# Altium schematic symbol library jlcpcb_2025_04_inductors_extended_0603.schlib: 1269 symbols (part 4 of 7) (continued)
## LQW18CNR47J00D
designator L?  Inductance: 470nH
Inductor, 470nH, ±5%, 450mΩ, 500mA, SMD 0603; Manufacturer: Murata Electronics; Manufacturer Part Number: LQW18CNR47J00D; Self-Resonant Frequency: 555MHz; Package Size: 0603; JLCPCB Basic Part: No; JLCPCB Part Number: C341701; Supplier 1: LCSC; Category: Inductors; Supplier Part Number 1: C341701; Tolerance: ±5%; Rated Current: 500mA; DC Resistance: 450mΩ; RoHS: Yes; ComponentLink1Description: Datasheet; ComponentLink1URL: https://wmsc.lcsc.com/wmsc/upload/file/pdf/v2/lcsc/2304140030_Murata-Electronics-LQW18CNR47J00D_C341701.pdf; ComponentLink2Description: JLCPCB Part URL; ComponentLink2URL: https://jlcpcb.com/partdetail/C341701; ComponentLink3Description: LCSC Part URL; ComponentLink3URL: https://lcsc.com/product-detail/Inductors-SMD_Murata-Electronics-Murata-Electronics-LQW18CNR47J00D_C341701.html
footprint IND-0603 (0603 (1608M) Inductor)
pins: 1, 2

## LQW18CNR47J0ZD
designator L?  Inductance: 470nH
Inductor, 470nH, ±5%, 450mΩ, 500mA, SMD 0603; Manufacturer: Murata Electronics; Manufacturer Part Number: LQW18CNR47J0ZD; Package Size: 0603; JLCPCB Basic Part: No; JLCPCB Part Number: C560039; Supplier 1: LCSC; Category: Inductors; Supplier Part Number 1: C560039; Tolerance: ±5%; Rated Current: 500mA; DC Resistance: 450mΩ; RoHS: Yes; ComponentLink1Description: Datasheet; ComponentLink1URL: https://wmsc.lcsc.com/wmsc/upload/file/pdf/v2/lcsc/2304140030_Murata-Electronics-LQW18CNR47J0ZD_C560039.pdf; ComponentLink2Description: JLCPCB Part URL; ComponentLink2URL: https://jlcpcb.com/partdetail/C560039; ComponentLink3Description: LCSC Part URL; ComponentLink3URL: https://lcsc.com/product-detail/Power-Inductors_Murata-Electronics-Murata-Electronics-LQW18CNR47J0ZD_C560039.html
footprint IND-0603 (0603 (1608M) Inductor)
pins: 1, 2

## LQW18CNR56J00D
designator L?  Inductance: 560nH
Inductor, 560nH, ±5%, 480mΩ, 450mA, SMD 0603; Manufacturer: Murata Electronics; Manufacturer Part Number: LQW18CNR56J00D; Self-Resonant Frequency: 10MHz; Package Size: 0603; JLCPCB Basic Part: No; JLCPCB Part Number: C91630; Supplier 1: LCSC; Category: Inductors; Supplier Part Number 1: C91630; Tolerance: ±5%; Rated Current: 450mA; DC Resistance: 480mΩ; RoHS: Yes; ComponentLink1Description: Datasheet; ComponentLink1URL: https://wmsc.lcsc.com/wmsc/upload/file/pdf/v2/lcsc/1810311111_Murata-Electronics-LQW18CNR56J00D_C91630.pdf; ComponentLink2Description: JLCPCB Part URL; ComponentLink2URL: https://jlcpcb.com/partdetail/C91630; ComponentLink3Description: LCSC Part URL; ComponentLink3URL: https://lcsc.com/product-detail/Inductors-SMD_Murata-Electronics-Murata-Electronics-LQW18CNR56J00D_C91630.html
footprint IND-0603 (0603 (1608M) Inductor)
pins: 1, 2

## LQW18CNR65J0ZD
designator L?  Inductance: 650nH
Inductor, 650nH, ±5%, 520mΩ, 430mA, SMD 0603; Manufacturer: Murata Electronics; Manufacturer Part Number: LQW18CNR65J0ZD; Self-Resonant Frequency: 510MHz; Package Size: 0603; JLCPCB Basic Part: No; JLCPCB Part Number: C1857960; Supplier 1: LCSC; Category: Inductors; Supplier Part Number 1: C1857960; Tolerance: ±5%; Rated Current: 430mA; DC Resistance: 520mΩ; RoHS: Yes; ComponentLink1Description: Datasheet; ComponentLink1URL: https://wmsc.lcsc.com/wmsc/upload/file/pdf/v2/lcsc/2304140030_Murata-Electronics-LQW18CNR65J0ZD_C1857960.pdf; ComponentLink2Description: JLCPCB Part URL; ComponentLink2URL: https://jlcpcb.com/partdetail/C1857960; ComponentLink3Description: LCSC Part URL; ComponentLink3URL: https://lcsc.com/product-detail/Inductors-SMD_Murata-Electronics-Murata-Electronics-LQW18CNR65J0ZD_C1857960.html
footprint IND-0603 (0603 (1608M) Inductor)
pins: 1, 2

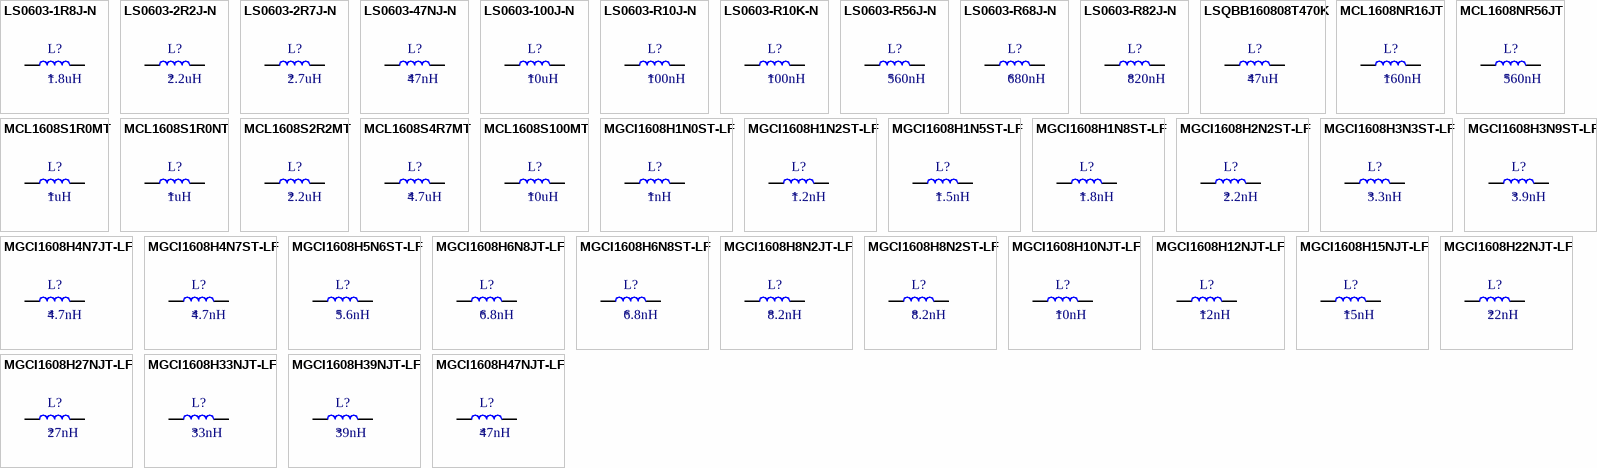
[diagram p18: symbols LS0603-1R8J-N to MGCI1608H47NJT-LF]

## LS0603-1R8J-N
designator L?  Inductance: 1.8uH
Inductor, 1.8uH, ±5%, 1.1Ω, 520mA, SMD 0603; Manufacturer: Chilisin Elec; Manufacturer Part Number: LS0603-1R8J-N; Self-Resonant Frequency: 230MHz; Q Factor: 17@7.9MHz; Package Size: 0603; JLCPCB Basic Part: No; JLCPCB Part Number: C142159; Supplier 1: LCSC; Category: Inductors; Supplier Part Number 1: C142159; Tolerance: ±5%; Rated Current: 520mA; DC Resistance: 1.1Ω; RoHS: Yes; ComponentLink1Description: Datasheet; ComponentLink1URL: https://wmsc.lcsc.com/wmsc/upload/file/pdf/v2/lcsc/2304140030_Chilisin-Elec-LS0603-1R8J-N_C142159.pdf; ComponentLink2Description: JLCPCB Part URL; ComponentLink2URL: https://jlcpcb.com/partdetail/C142159; ComponentLink3Description: LCSC Part URL; ComponentLink3URL: https://lcsc.com/product-detail/Inductors-SMD_Chilisin-Elec-Chilisin-Elec-LS0603-1R8J-N_C142159.html
footprint IND-0603 (0603 (1608M) Inductor)
pins: 1, 2

## LS0603-2R2J-N
designator L?  Inductance: 2.2uH
Inductor, 2.2uH, ±5%, 1200mΩ, 500mA, SMD 0603; Manufacturer: Chilisin Elec; Manufacturer Part Number: LS0603-2R2J-N; Self-Resonant Frequency: 140MHz; Q Factor: 17@7.9MHz; Package Size: 0603; JLCPCB Basic Part: No; JLCPCB Part Number: C2935084; Supplier 1: LCSC; Category: Inductors; Supplier Part Number 1: C2935084; Tolerance: ±5%; Rated Current: 500mA; DC Resistance: 1200mΩ; RoHS: Yes; ComponentLink1Description: Datasheet; ComponentLink1URL: https://wmsc.lcsc.com/wmsc/upload/file/pdf/v2/lcsc/2403291731_Chilisin-Elec-LS0603-2R2J-N_C2935084.pdf; ComponentLink2Description: JLCPCB Part URL; ComponentLink2URL: https://jlcpcb.com/partdetail/C2935084; ComponentLink3Description: LCSC Part URL; ComponentLink3URL: https://lcsc.com/product-detail/Inductors-SMD_Chilisin-Elec-Chilisin-Elec-LS0603-2R2J-N_C2935084.html
footprint IND-0603 (0603 (1608M) Inductor)
pins: 1, 2

## LS0603-2R7J-N
designator L?  Inductance: 2.7uH
Inductor, 2.7uH, ±5%, 1.5Ω, 480mA, SMD 0603; Manufacturer: Chilisin Elec; Manufacturer Part Number: LS0603-2R7J-N; Self-Resonant Frequency: 105MHz; Q Factor: 17@7.9MHz; Package Size: 0603; JLCPCB Basic Part: No; JLCPCB Part Number: C280485; Supplier 1: LCSC; Category: Inductors; Supplier Part Number 1: C280485; Tolerance: ±5%; Rated Current: 480mA; DC Resistance: 1.5Ω; RoHS: Yes; ComponentLink1Description: Datasheet; ComponentLink1URL: https://wmsc.lcsc.com/wmsc/upload/file/pdf/v2/lcsc/2304140030_Chilisin-Elec-LS0603-2R7J-N_C280485.pdf; ComponentLink2Description: JLCPCB Part URL; ComponentLink2URL: https://jlcpcb.com/partdetail/C280485; ComponentLink3Description: LCSC Part URL; ComponentLink3URL: https://lcsc.com/product-detail/Inductors-SMD_Chilisin-Elec-Chilisin-Elec-LS0603-2R7J-N_C280485.html
footprint IND-0603 (0603 (1608M) Inductor)
pins: 1, 2

## LS0603-47NJ-N
designator L?  Inductance: 47nH
Inductor, 47nH, ±5%, 75mΩ, 1.5A, SMD 0603; Manufacturer: Chilisin Elec; Manufacturer Part Number: LS0603-47NJ-N; Self-Resonant Frequency: 1.7GHz; Q Factor: 17@7.9MHz; Package Size: 0603; JLCPCB Basic Part: No; JLCPCB Part Number: C285885; Supplier 1: LCSC; Category: Inductors; Supplier Part Number 1: C285885; Tolerance: ±5%; Rated Current: 1.5A; DC Resistance: 75mΩ; RoHS: Yes; ComponentLink1Description: Datasheet; ComponentLink1URL: https://wmsc.lcsc.com/wmsc/upload/file/pdf/v2/lcsc/2304140030_Chilisin-Elec-LS0603-47NJ-N_C285885.pdf; ComponentLink2Description: JLCPCB Part URL; ComponentLink2URL: https://jlcpcb.com/partdetail/C285885; ComponentLink3Description: LCSC Part URL; ComponentLink3URL: https://lcsc.com/product-detail/Inductors-SMD_Chilisin-Elec-Chilisin-Elec-LS0603-47NJ-N_C285885.html
footprint IND-0603 (0603 (1608M) Inductor)
pins: 1, 2

## LS0603-100J-N
designator L?  Inductance: 10uH
Inductor, 10uH, ±5%, 4.8Ω, 300mA, SMD 0603; Manufacturer: Chilisin Elec; Manufacturer Part Number: LS0603-100J-N; Self-Resonant Frequency: 40MHz; Q Factor: 19@7.9MHz; Package Size: 0603; JLCPCB Basic Part: No; JLCPCB Part Number: C373750; Supplier 1: LCSC; Category: Inductors; Supplier Part Number 1: C373750; Tolerance: ±5%; Rated Current: 300mA; DC Resistance: 4.8Ω; RoHS: Yes; ComponentLink1Description: Datasheet; ComponentLink1URL: https://wmsc.lcsc.com/wmsc/upload/file/pdf/v2/lcsc/2304140030_Chilisin-Elec-LS0603-100J-N_C373750.pdf; ComponentLink2Description: JLCPCB Part URL; ComponentLink2URL: https://jlcpcb.com/partdetail/C373750; ComponentLink3Description: LCSC Part URL; ComponentLink3URL: https://lcsc.com/product-detail/Inductors-SMD_Chilisin-Elec-Chilisin-Elec-LS0603-100J-N_C373750.html
footprint IND-0603 (0603 (1608M) Inductor)
pins: 1, 2

## LS0603-R10J-N
designator L?  Inductance: 100nH
Inductor, 100nH, ±5%, 130mΩ, 1.5A, SMD 0603; Manufacturer: Chilisin Elec; Manufacturer Part Number: LS0603-R10J-N; Self-Resonant Frequency: 1.65GHz; Q Factor: 17@7.9MHz; Package Size: 0603; JLCPCB Basic Part: No; JLCPCB Part Number: C285884; Supplier 1: LCSC; Category: Inductors; Supplier Part Number 1: C285884; Tolerance: ±5%; Rated Current: 1.5A; DC Resistance: 130mΩ; RoHS: Yes; ComponentLink1Description: Datasheet; ComponentLink1URL: https://wmsc.lcsc.com/wmsc/upload/file/pdf/v2/lcsc/2304140030_Chilisin-Elec-LS0603-R10J-N_C285884.pdf; ComponentLink2Description: JLCPCB Part URL; ComponentLink2URL: https://jlcpcb.com/partdetail/C285884; ComponentLink3Description: LCSC Part URL; ComponentLink3URL: https://lcsc.com/product-detail/Inductors-SMD_Chilisin-Elec-Chilisin-Elec-LS0603-R10J-N_C285884.html
footprint IND-0603 (0603 (1608M) Inductor)
pins: 1, 2

## LS0603-R10K-N
designator L?  Inductance: 100nH
Inductor, 100nH, ±10%, 130mΩ, 1.5A, SMD 0603; Manufacturer: Chilisin Elec; Manufacturer Part Number: LS0603-R10K-N; Self-Resonant Frequency: 1.65GHz; Q Factor: 17@7.9MHz; Package Size: 0603; JLCPCB Basic Part: No; JLCPCB Part Number: C285883; Supplier 1: LCSC; Category: Inductors; Supplier Part Number 1: C285883; Tolerance: ±10%; Rated Current: 1.5A; DC Resistance: 130mΩ; RoHS: Yes; ComponentLink1Description: Datasheet; ComponentLink1URL: https://wmsc.lcsc.com/wmsc/upload/file/pdf/v2/lcsc/2304140030_Chilisin-Elec-LS0603-R10K-N_C285883.pdf; ComponentLink2Description: JLCPCB Part URL; ComponentLink2URL: https://jlcpcb.com/partdetail/C285883; ComponentLink3Description: LCSC Part URL; ComponentLink3URL: https://lcsc.com/product-detail/Inductors-SMD_Chilisin-Elec-Chilisin-Elec-LS0603-R10K-N_C285883.html
footprint IND-0603 (0603 (1608M) Inductor)
pins: 1, 2

## LS0603-R56J-N
designator L?  Inductance: 560nH
Inductor, 560nH, ±5%, 440mΩ, 850mA, SMD 0603; Manufacturer: Chilisin Elec; Manufacturer Part Number: LS0603-R56J-N; Self-Resonant Frequency: 600MHz; Q Factor: 17@7.9MHz; Package Size: 0603; JLCPCB Basic Part: No; JLCPCB Part Number: C472422; Supplier 1: LCSC; Category: Inductors; Supplier Part Number 1: C472422; Tolerance: ±5%; Rated Current: 850mA; DC Resistance: 440mΩ; RoHS: Yes; ComponentLink1Description: Datasheet; ComponentLink1URL: https://wmsc.lcsc.com/wmsc/upload/file/pdf/v2/lcsc/2304140030_Chilisin-Elec-LS0603-R56J-N_C472422.pdf; ComponentLink2Description: JLCPCB Part URL; ComponentLink2URL: https://jlcpcb.com/partdetail/C472422; ComponentLink3Description: LCSC Part URL; ComponentLink3URL: https://lcsc.com/product-detail/Inductors-SMD_Chilisin-Elec-Chilisin-Elec-LS0603-R56J-N_C472422.html
footprint IND-0603 (0603 (1608M) Inductor)
pins: 1, 2

## LS0603-R68J-N
designator L?  Inductance: 680nH
Inductor, 680nH, ±5%, 520mΩ, 850mA, SMD 0603; Manufacturer: Chilisin Elec; Manufacturer Part Number: LS0603-R68J-N; Self-Resonant Frequency: 600MHz; Q Factor: 17@7.9MHz; Package Size: 0603; JLCPCB Basic Part: No; JLCPCB Part Number: C280487; Supplier 1: LCSC; Category: Inductors; Supplier Part Number 1: C280487; Tolerance: ±5%; Rated Current: 850mA; DC Resistance: 520mΩ; RoHS: Yes; ComponentLink1Description: Datasheet; ComponentLink1URL: https://wmsc.lcsc.com/wmsc/upload/file/pdf/v2/lcsc/2304140030_Chilisin-Elec-LS0603-R68J-N_C280487.pdf; ComponentLink2Description: JLCPCB Part URL; ComponentLink2URL: https://jlcpcb.com/partdetail/C280487; ComponentLink3Description: LCSC Part URL; ComponentLink3URL: https://lcsc.com/product-detail/Inductors-SMD_Chilisin-Elec-Chilisin-Elec-LS0603-R68J-N_C280487.html
footprint IND-0603 (0603 (1608M) Inductor)
pins: 1, 2

## LS0603-R82J-N
designator L?  Inductance: 820nH
Inductor, 820nH, ±5%, 690mΩ, 750mA, SMD 0603; Manufacturer: Chilisin Elec; Manufacturer Part Number: LS0603-R82J-N; Self-Resonant Frequency: 480MHz; Q Factor: 17@7.9MHz; Package Size: 0603; JLCPCB Basic Part: No; JLCPCB Part Number: C280488; Supplier 1: LCSC; Category: Inductors; Supplier Part Number 1: C280488; Tolerance: ±5%; Rated Current: 750mA; DC Resistance: 690mΩ; RoHS: Yes; ComponentLink1Description: Datasheet; ComponentLink1URL: https://wmsc.lcsc.com/wmsc/upload/file/pdf/v2/lcsc/2304140030_Chilisin-Elec-LS0603-R82J-N_C280488.pdf; ComponentLink2Description: JLCPCB Part URL; ComponentLink2URL: https://jlcpcb.com/partdetail/C280488; ComponentLink3Description: LCSC Part URL; ComponentLink3URL: https://lcsc.com/product-detail/Inductors-SMD_Chilisin-Elec-Chilisin-Elec-LS0603-R82J-N_C280488.html
footprint IND-0603 (0603 (1608M) Inductor)
pins: 1, 2

## LSQBB160808T470K
designator L?  Inductance: 47uH
Inductor, 47uH, ±10%, 2.5Ω, 35mA, SMD 0603; Manufacturer: Taiyo Yuden; Manufacturer Part Number: LSQBB160808T470K; Package Size: 0603; JLCPCB Basic Part: No; JLCPCB Part Number: C223245; Supplier 1: LCSC; Category: Inductors; Supplier Part Number 1: C223245; Tolerance: ±10%; Rated Current: 35mA; DC Resistance: 2.5Ω; RoHS: Yes; ComponentLink1Description: Datasheet; ComponentLink2Description: JLCPCB Part URL; ComponentLink2URL: https://jlcpcb.com/partdetail/C223245; ComponentLink3Description: LCSC Part URL; ComponentLink3URL: https://lcsc.com/product-detail/Inductors-SMD_Taiyo-Yuden-Taiyo-Yuden-LBMF1608T470K_C223245.html
footprint IND-0603 (0603 (1608M) Inductor)
pins: 1, 2

## MCL1608NR16JT
designator L?  Inductance: 160nH
Inductor, 160nH, ±5%, 156mΩ, 700mA, SMD 0603; Manufacturer: Sunlord; Manufacturer Part Number: MCL1608NR16JT; Saturation Current: 1.1A; Package Size: 0603; JLCPCB Basic Part: No; JLCPCB Part Number: C370008; Supplier 1: LCSC; Category: Inductors; Supplier Part Number 1: C370008; Tolerance: ±5%; Rated Current: 700mA; DC Resistance: 156mΩ; RoHS: Yes; ComponentLink1Description: Datasheet; ComponentLink1URL: https://wmsc.lcsc.com/wmsc/upload/file/pdf/v2/lcsc/2310271619_Sunlord-MCL1608NR16JT_C370008.pdf; ComponentLink2Description: JLCPCB Part URL; ComponentLink2URL: https://jlcpcb.com/partdetail/C370008; ComponentLink3Description: LCSC Part URL; ComponentLink3URL: https://lcsc.com/product-detail/Inductors-SMD_Sunlord-Sunlord-MCL1608NR16JT_C370008.html
footprint IND-0603 (0603 (1608M) Inductor)
pins: 1, 2

## MCL1608NR56JT
designator L?  Inductance: 560nH
Inductor, 560nH, ±5%, 520mΩ, 400mA, SMD 0603; Manufacturer: Sunlord; Manufacturer Part Number: MCL1608NR56JT; Saturation Current: 550mA; Self-Resonant Frequency: 25MHz; Package Size: 0603; JLCPCB Basic Part: No; JLCPCB Part Number: C370009; Supplier 1: LCSC; Category: Inductors; Supplier Part Number 1: C370009; Tolerance: ±5%; Rated Current: 400mA; DC Resistance: 520mΩ; RoHS: Yes; ComponentLink1Description: Datasheet; ComponentLink1URL: https://wmsc.lcsc.com/wmsc/upload/file/pdf/v2/lcsc/2310271619_Sunlord-MCL1608NR56JT_C370009.pdf; ComponentLink2Description: JLCPCB Part URL; ComponentLink2URL: https://jlcpcb.com/partdetail/C370009; ComponentLink3Description: LCSC Part URL; ComponentLink3URL: https://lcsc.com/product-detail/Inductors-SMD_Sunlord-Sunlord-MCL1608NR56JT_C370009.html
footprint IND-0603 (0603 (1608M) Inductor)
pins: 1, 2

## MCL1608S1R0MT
designator L?  Inductance: 1uH
Inductor, 1uH, ±20%, 260mΩ, 190mA, SMD 0603; Manufacturer: Sunlord; Manufacturer Part Number: MCL1608S1R0MT; Self-Resonant Frequency: 75MHz; Package Size: 0603; JLCPCB Basic Part: No; JLCPCB Part Number: C98324; Supplier 1: LCSC; Category: Inductors; Supplier Part Number 1: C98324; Tolerance: ±20%; Rated Current: 190mA; DC Resistance: 260mΩ; RoHS: Yes; ComponentLink1Description: Datasheet; ComponentLink1URL: https://wmsc.lcsc.com/wmsc/upload/file/pdf/v2/lcsc/2310301640_Sunlord-MCL1608S1R0MT_C98324.pdf; ComponentLink2Description: JLCPCB Part URL; ComponentLink2URL: https://jlcpcb.com/partdetail/C98324; ComponentLink3Description: LCSC Part URL; ComponentLink3URL: https://lcsc.com/product-detail/Inductors-SMD_Sunlord-Sunlord-MCL1608S1R0MT_C98324.html
footprint IND-0603 (0603 (1608M) Inductor)
pins: 1, 2

## MCL1608S1R0NT
designator L?  Inductance: 1uH
Inductor, 1uH, SMD 0603; Manufacturer: Sunlord; Manufacturer Part Number: MCL1608S1R0NT; Package Size: 0603; JLCPCB Basic Part: No; JLCPCB Part Number: C2991761; Supplier 1: LCSC; Category: Inductors; Supplier Part Number 1: C2991761; RoHS: Yes; ComponentLink1Description: Datasheet; ComponentLink1URL: https://wmsc.lcsc.com/wmsc/upload/file/pdf/v2/lcsc/2310301640_Sunlord-MCL1608S1R0NT_C2991761.pdf; ComponentLink2Description: JLCPCB Part URL; ComponentLink2URL: https://jlcpcb.com/partdetail/C2991761; ComponentLink3Description: LCSC Part URL; ComponentLink3URL: https://lcsc.com/product-detail/Inductors-SMD_Sunlord-Sunlord-MCL1608S1R0NT_C2991761.html
footprint IND-0603 (0603 (1608M) Inductor)
pins: 1, 2

## MCL1608S2R2MT
designator L?  Inductance: 2.2uH
Inductor, 2.2uH, ±20%, 520mΩ, 140mA, SMD 0603; Manufacturer: Sunlord; Manufacturer Part Number: MCL1608S2R2MT; Package Size: 0603; JLCPCB Basic Part: No; JLCPCB Part Number: C95966; Supplier 1: LCSC; Category: Inductors; Supplier Part Number 1: C95966; Tolerance: ±20%; Rated Current: 140mA; DC Resistance: 520mΩ; RoHS: Yes; ComponentLink1Description: Datasheet; ComponentLink1URL: https://wmsc.lcsc.com/wmsc/upload/file/pdf/v2/lcsc/2310301640_Sunlord-MCL1608S2R2MT_C95966.pdf; ComponentLink2Description: JLCPCB Part URL; ComponentLink2URL: https://jlcpcb.com/partdetail/C95966; ComponentLink3Description: LCSC Part URL; ComponentLink3URL: https://lcsc.com/product-detail/Inductors-SMD_Sunlord-Sunlord-MCL1608S2R2MT_C95966.html
footprint IND-0603 (0603 (1608M) Inductor)
pins: 1, 2

## MCL1608S4R7MT
designator L?  Inductance: 4.7uH
Inductor, 4.7uH, ±20%, 780mΩ, 100mA, SMD 0603; Manufacturer: Sunlord; Manufacturer Part Number: MCL1608S4R7MT; Self-Resonant Frequency: 35MHz; Package Size: 0603; JLCPCB Basic Part: No; JLCPCB Part Number: C43722; Supplier 1: LCSC; Category: Inductors; Supplier Part Number 1: C43722; Tolerance: ±20%; Rated Current: 100mA; DC Resistance: 780mΩ; RoHS: Yes; ComponentLink1Description: Datasheet; ComponentLink1URL: https://wmsc.lcsc.com/wmsc/upload/file/pdf/v2/lcsc/2310301640_Sunlord-MCL1608S4R7MT_C43722.pdf; ComponentLink2Description: JLCPCB Part URL; ComponentLink2URL: https://jlcpcb.com/partdetail/C43722; ComponentLink3Description: LCSC Part URL; ComponentLink3URL: https://lcsc.com/product-detail/Inductors-SMD_Sunlord-Sunlord-MCL1608S4R7MT_C43722.html
footprint IND-0603 (0603 (1608M) Inductor)
pins: 1, 2

## MCL1608S100MT
designator L?  Inductance: 10uH
Inductor, 10uH, ±20%, 1.17Ω, 50mA, SMD 0603; Manufacturer: Sunlord; Manufacturer Part Number: MCL1608S100MT; Self-Resonant Frequency: 20MHz; Package Size: 0603; JLCPCB Basic Part: No; JLCPCB Part Number: C51942; Supplier 1: LCSC; Category: Inductors; Supplier Part Number 1: C51942; Tolerance: ±20%; Rated Current: 50mA; DC Resistance: 1.17Ω; RoHS: Yes; ComponentLink1Description: Datasheet; ComponentLink1URL: https://wmsc.lcsc.com/wmsc/upload/file/pdf/v2/lcsc/2310271620_Sunlord-MCL1608S100MT_C51942.pdf; ComponentLink2Description: JLCPCB Part URL; ComponentLink2URL: https://jlcpcb.com/partdetail/C51942; ComponentLink3Description: LCSC Part URL; ComponentLink3URL: https://lcsc.com/product-detail/Inductors-SMD_Sunlord-Sunlord-MCL1608S100MT_C51942.html
footprint IND-0603 (0603 (1608M) Inductor)
pins: 1, 2

## MGCI1608H1N0ST-LF
designator L?  Inductance: 1nH
Inductor, 1nH, 50mΩ, 500mA, SMD 0603; Manufacturer: microgate; Manufacturer Part Number: MGCI1608H1N0ST-LF; Package Size: 0603; JLCPCB Basic Part: No; JLCPCB Part Number: C281020; Supplier 1: LCSC; Category: Inductors; Supplier Part Number 1: C281020; Rated Current: 500mA; DC Resistance: 50mΩ; RoHS: Yes; ComponentLink1Description: Datasheet; ComponentLink1URL: https://wmsc.lcsc.com/wmsc/upload/file/pdf/v2/lcsc/2304140030_microgate-MGCI1608H1N0ST-LF_C281020.pdf; ComponentLink2Description: JLCPCB Part URL; ComponentLink2URL: https://jlcpcb.com/partdetail/C281020; ComponentLink3Description: LCSC Part URL; ComponentLink3URL: https://lcsc.com/product-detail/Inductors-SMD_microgate-microgate-MGCI1608H1N0ST-LF_C281020.html
footprint IND-0603 (0603 (1608M) Inductor)
pins: 1, 2

## MGCI1608H1N2ST-LF
designator L?  Inductance: 1.2nH
Inductor, 1.2nH, 50mΩ, 500mA, SMD 0603; Manufacturer: microgate; Manufacturer Part Number: MGCI1608H1N2ST-LF; Package Size: 0603; JLCPCB Basic Part: No; JLCPCB Part Number: C281021; Supplier 1: LCSC; Category: Inductors; Supplier Part Number 1: C281021; Rated Current: 500mA; DC Resistance: 50mΩ; RoHS: Yes; ComponentLink1Description: Datasheet; ComponentLink1URL: https://wmsc.lcsc.com/wmsc/upload/file/pdf/v2/lcsc/2304140030_microgate-MGCI1608H1N2ST-LF_C281021.pdf; ComponentLink2Description: JLCPCB Part URL; ComponentLink2URL: https://jlcpcb.com/partdetail/C281021; ComponentLink3Description: LCSC Part URL; ComponentLink3URL: https://lcsc.com/product-detail/Inductors-SMD_microgate-microgate-MGCI1608H1N2ST-LF_C281021.html
footprint IND-0603 (0603 (1608M) Inductor)
pins: 1, 2

## MGCI1608H1N5ST-LF
designator L?  Inductance: 1.5nH
Inductor, 1.5nH, 100mΩ, 500mA, SMD 0603; Manufacturer: microgate; Manufacturer Part Number: MGCI1608H1N5ST-LF; Package Size: 0603; JLCPCB Basic Part: No; JLCPCB Part Number: C281022; Supplier 1: LCSC; Category: Inductors; Supplier Part Number 1: C281022; Rated Current: 500mA; DC Resistance: 100mΩ; RoHS: Yes; ComponentLink1Description: Datasheet; ComponentLink1URL: https://wmsc.lcsc.com/wmsc/upload/file/pdf/v2/lcsc/2304140030_microgate-MGCI1608H1N5ST-LF_C281022.pdf; ComponentLink2Description: JLCPCB Part URL; ComponentLink2URL: https://jlcpcb.com/partdetail/C281022; ComponentLink3Description: LCSC Part URL; ComponentLink3URL: https://lcsc.com/product-detail/Inductors-SMD_microgate-microgate-MGCI1608H1N5ST-LF_C281022.html
footprint IND-0603 (0603 (1608M) Inductor)
pins: 1, 2

## MGCI1608H1N8ST-LF
designator L?  Inductance: 1.8nH
Inductor, 1.8nH, 100mΩ, 500mA, SMD 0603; Manufacturer: microgate; Manufacturer Part Number: MGCI1608H1N8ST-LF; Package Size: 0603; JLCPCB Basic Part: No; JLCPCB Part Number: C281023; Supplier 1: LCSC; Category: Inductors; Supplier Part Number 1: C281023; Rated Current: 500mA; DC Resistance: 100mΩ; RoHS: Yes; ComponentLink1Description: Datasheet; ComponentLink1URL: https://wmsc.lcsc.com/wmsc/upload/file/pdf/v2/lcsc/2304140030_microgate-MGCI1608H1N8ST-LF_C281023.pdf; ComponentLink2Description: JLCPCB Part URL; ComponentLink2URL: https://jlcpcb.com/partdetail/C281023; ComponentLink3Description: LCSC Part URL; ComponentLink3URL: https://lcsc.com/product-detail/Inductors-SMD_microgate-microgate-MGCI1608H1N8ST-LF_C281023.html
footprint IND-0603 (0603 (1608M) Inductor)
pins: 1, 2

## MGCI1608H2N2ST-LF
designator L?  Inductance: 2.2nH
Inductor, 2.2nH, 100mΩ, 500mA, SMD 0603; Manufacturer: microgate; Manufacturer Part Number: MGCI1608H2N2ST-LF; Package Size: 0603; JLCPCB Basic Part: No; JLCPCB Part Number: C281024; Supplier 1: LCSC; Category: Inductors; Supplier Part Number 1: C281024; Rated Current: 500mA; DC Resistance: 100mΩ; RoHS: Yes; ComponentLink1Description: Datasheet; ComponentLink1URL: https://wmsc.lcsc.com/wmsc/upload/file/pdf/v2/lcsc/2304140030_microgate-MGCI1608H2N2ST-LF_C281024.pdf; ComponentLink2Description: JLCPCB Part URL; ComponentLink2URL: https://jlcpcb.com/partdetail/C281024; ComponentLink3Description: LCSC Part URL; ComponentLink3URL: https://lcsc.com/product-detail/Inductors-SMD_microgate-microgate-MGCI1608H2N2ST-LF_C281024.html
footprint IND-0603 (0603 (1608M) Inductor)
pins: 1, 2

## MGCI1608H3N3ST-LF
designator L?  Inductance: 3.3nH
Inductor, 3.3nH, 120mΩ, 500mA, SMD 0603; Manufacturer: microgate; Manufacturer Part Number: MGCI1608H3N3ST-LF; Package Size: 0603; JLCPCB Basic Part: No; JLCPCB Part Number: C281026; Supplier 1: LCSC; Category: Inductors; Supplier Part Number 1: C281026; Rated Current: 500mA; DC Resistance: 120mΩ; RoHS: Yes; ComponentLink1Description: Datasheet; ComponentLink1URL: https://wmsc.lcsc.com/wmsc/upload/file/pdf/v2/lcsc/2304140030_microgate-MGCI1608H3N3ST-LF_C281026.pdf; ComponentLink2Description: JLCPCB Part URL; ComponentLink2URL: https://jlcpcb.com/partdetail/C281026; ComponentLink3Description: LCSC Part URL; ComponentLink3URL: https://lcsc.com/product-detail/Inductors-SMD_microgate-microgate-MGCI1608H3N3ST-LF_C281026.html
footprint IND-0603 (0603 (1608M) Inductor)
pins: 1, 2

## MGCI1608H3N9ST-LF
designator L?  Inductance: 3.9nH
Inductor, 3.9nH, 140mΩ, 500mA, SMD 0603; Manufacturer: microgate; Manufacturer Part Number: MGCI1608H3N9ST-LF; Package Size: 0603; JLCPCB Basic Part: No; JLCPCB Part Number: C281027; Supplier 1: LCSC; Category: Inductors; Supplier Part Number 1: C281027; Rated Current: 500mA; DC Resistance: 140mΩ; RoHS: Yes; ComponentLink1Description: Datasheet; ComponentLink1URL: https://wmsc.lcsc.com/wmsc/upload/file/pdf/v2/lcsc/2304140030_microgate-MGCI1608H3N9ST-LF_C281027.pdf; ComponentLink2Description: JLCPCB Part URL; ComponentLink2URL: https://jlcpcb.com/partdetail/C281027; ComponentLink3Description: LCSC Part URL; ComponentLink3URL: https://lcsc.com/product-detail/Inductors-SMD_microgate-microgate-MGCI1608H3N9ST-LF_C281027.html
footprint IND-0603 (0603 (1608M) Inductor)
pins: 1, 2

## MGCI1608H4N7JT-LF
designator L?  Inductance: 4.7nH
Inductor, 4.7nH, ±5%, 160mΩ, 500mA, SMD 0603; Manufacturer: microgate; Manufacturer Part Number: MGCI1608H4N7JT-LF; Package Size: 0603; JLCPCB Basic Part: No; JLCPCB Part Number: C281028; Supplier 1: LCSC; Category: Inductors; Supplier Part Number 1: C281028; Tolerance: ±5%; Rated Current: 500mA; DC Resistance: 160mΩ; RoHS: Yes; ComponentLink1Description: Datasheet; ComponentLink1URL: https://wmsc.lcsc.com/wmsc/upload/file/pdf/v2/lcsc/2304140030_microgate-MGCI1608H4N7JT-LF_C281028.pdf; ComponentLink2Description: JLCPCB Part URL; ComponentLink2URL: https://jlcpcb.com/partdetail/C281028; ComponentLink3Description: LCSC Part URL; ComponentLink3URL: https://lcsc.com/product-detail/Inductors-SMD_microgate-microgate-MGCI1608H4N7JT-LF_C281028.html
footprint IND-0603 (0603 (1608M) Inductor)
pins: 1, 2

## MGCI1608H4N7ST-LF
designator L?  Inductance: 4.7nH
Inductor, 4.7nH, 160mΩ, 500mA, SMD 0603; Manufacturer: microgate; Manufacturer Part Number: MGCI1608H4N7ST-LF; Package Size: 0603; JLCPCB Basic Part: No; JLCPCB Part Number: C281029; Supplier 1: LCSC; Category: Inductors; Supplier Part Number 1: C281029; Rated Current: 500mA; DC Resistance: 160mΩ; RoHS: Yes; ComponentLink1Description: Datasheet; ComponentLink1URL: https://wmsc.lcsc.com/wmsc/upload/file/pdf/v2/lcsc/2304140030_microgate-MGCI1608H4N7ST-LF_C281029.pdf; ComponentLink2Description: JLCPCB Part URL; ComponentLink2URL: https://jlcpcb.com/partdetail/C281029; ComponentLink3Description: LCSC Part URL; ComponentLink3URL: https://lcsc.com/product-detail/Inductors-SMD_microgate-microgate-MGCI1608H4N7ST-LF_C281029.html
footprint IND-0603 (0603 (1608M) Inductor)
pins: 1, 2

## MGCI1608H5N6ST-LF
designator L?  Inductance: 5.6nH
Inductor, 5.6nH, 180mΩ, 500mA, SMD 0603; Manufacturer: microgate; Manufacturer Part Number: MGCI1608H5N6ST-LF; Package Size: 0603; JLCPCB Basic Part: No; JLCPCB Part Number: C281030; Supplier 1: LCSC; Category: Inductors; Supplier Part Number 1: C281030; Rated Current: 500mA; DC Resistance: 180mΩ; RoHS: Yes; ComponentLink1Description: Datasheet; ComponentLink1URL: https://wmsc.lcsc.com/wmsc/upload/file/pdf/v2/lcsc/2304140030_microgate-MGCI1608H5N6ST-LF_C281030.pdf; ComponentLink2Description: JLCPCB Part URL; ComponentLink2URL: https://jlcpcb.com/partdetail/C281030; ComponentLink3Description: LCSC Part URL; ComponentLink3URL: https://lcsc.com/product-detail/Inductors-SMD_microgate-microgate-MGCI1608H5N6ST-LF_C281030.html
footprint IND-0603 (0603 (1608M) Inductor)
pins: 1, 2

## MGCI1608H6N8JT-LF
designator L?  Inductance: 6.8nH
Inductor, 6.8nH, ±5%, 220mΩ, 500mA, SMD 0603; Manufacturer: microgate; Manufacturer Part Number: MGCI1608H6N8JT-LF; Package Size: 0603; JLCPCB Basic Part: No; JLCPCB Part Number: C281031; Supplier 1: LCSC; Category: Inductors; Supplier Part Number 1: C281031; Tolerance: ±5%; Rated Current: 500mA; DC Resistance: 220mΩ; RoHS: Yes; ComponentLink1Description: Datasheet; ComponentLink1URL: https://wmsc.lcsc.com/wmsc/upload/file/pdf/v2/lcsc/2304140030_microgate-MGCI1608H6N8JT-LF_C281031.pdf; ComponentLink2Description: JLCPCB Part URL; ComponentLink2URL: https://jlcpcb.com/partdetail/C281031; ComponentLink3Description: LCSC Part URL; ComponentLink3URL: https://lcsc.com/product-detail/Inductors-SMD_microgate-microgate-MGCI1608H6N8JT-LF_C281031.html
footprint IND-0603 (0603 (1608M) Inductor)
pins: 1, 2

## MGCI1608H6N8ST-LF
designator L?  Inductance: 6.8nH
Inductor, 6.8nH, 220mΩ, 500mA, SMD 0603; Manufacturer: microgate; Manufacturer Part Number: MGCI1608H6N8ST-LF; Package Size: 0603; JLCPCB Basic Part: No; JLCPCB Part Number: C281032; Supplier 1: LCSC; Category: Inductors; Supplier Part Number 1: C281032; Rated Current: 500mA; DC Resistance: 220mΩ; RoHS: Yes; ComponentLink1Description: Datasheet; ComponentLink1URL: https://wmsc.lcsc.com/wmsc/upload/file/pdf/v2/lcsc/2304140030_microgate-MGCI1608H6N8ST-LF_C281032.pdf; ComponentLink2Description: JLCPCB Part URL; ComponentLink2URL: https://jlcpcb.com/partdetail/C281032; ComponentLink3Description: LCSC Part URL; ComponentLink3URL: https://lcsc.com/product-detail/Inductors-SMD_microgate-microgate-MGCI1608H6N8ST-LF_C281032.html
footprint IND-0603 (0603 (1608M) Inductor)
pins: 1, 2

## MGCI1608H8N2JT-LF
designator L?  Inductance: 8.2nH
Inductor, 8.2nH, ±5%, 240mΩ, 500mA, SMD 0603; Manufacturer: microgate; Manufacturer Part Number: MGCI1608H8N2JT-LF; Package Size: 0603; JLCPCB Basic Part: No; JLCPCB Part Number: C310889; Supplier 1: LCSC; Category: Inductors; Supplier Part Number 1: C310889; Tolerance: ±5%; Rated Current: 500mA; DC Resistance: 240mΩ; RoHS: Yes; ComponentLink1Description: Datasheet; ComponentLink1URL: https://wmsc.lcsc.com/wmsc/upload/file/pdf/v2/lcsc/2304140030_microgate-MGCI1608H8N2JT-LF_C310889.pdf; ComponentLink2Description: JLCPCB Part URL; ComponentLink2URL: https://jlcpcb.com/partdetail/C310889; ComponentLink3Description: LCSC Part URL; ComponentLink3URL: https://lcsc.com/product-detail/Inductors-SMD_microgate-microgate-MGCI1608H8N2JT-LF_C310889.html
footprint IND-0603 (0603 (1608M) Inductor)
pins: 1, 2

## MGCI1608H8N2ST-LF
designator L?  Inductance: 8.2nH
Inductor, 8.2nH, 240mΩ, 500mA, SMD 0603; Manufacturer: microgate; Manufacturer Part Number: MGCI1608H8N2ST-LF; Package Size: 0603; JLCPCB Basic Part: No; JLCPCB Part Number: C281034; Supplier 1: LCSC; Category: Inductors; Supplier Part Number 1: C281034; Rated Current: 500mA; DC Resistance: 240mΩ; RoHS: Yes; ComponentLink1Description: Datasheet; ComponentLink1URL: https://wmsc.lcsc.com/wmsc/upload/file/pdf/v2/lcsc/2304140030_microgate-MGCI1608H8N2ST-LF_C281034.pdf; ComponentLink2Description: JLCPCB Part URL; ComponentLink2URL: https://jlcpcb.com/partdetail/C281034; ComponentLink3Description: LCSC Part URL; ComponentLink3URL: https://lcsc.com/product-detail/Inductors-SMD_microgate-microgate-MGCI1608H8N2ST-LF_C281034.html
footprint IND-0603 (0603 (1608M) Inductor)
pins: 1, 2

## MGCI1608H10NJT-LF
designator L?  Inductance: 10nH
Inductor, 10nH, ±5%, 260mΩ, 300mA, SMD 0603; Manufacturer: microgate; Manufacturer Part Number: MGCI1608H10NJT-LF; Package Size: 0603; JLCPCB Basic Part: No; JLCPCB Part Number: C281018; Supplier 1: LCSC; Category: Inductors; Supplier Part Number 1: C281018; Tolerance: ±5%; Rated Current: 300mA; DC Resistance: 260mΩ; RoHS: Yes; ComponentLink1Description: Datasheet; ComponentLink1URL: https://wmsc.lcsc.com/wmsc/upload/file/pdf/v2/lcsc/2304140030_microgate-MGCI1608H10NJT-LF_C281018.pdf; ComponentLink2Description: JLCPCB Part URL; ComponentLink2URL: https://jlcpcb.com/partdetail/C281018; ComponentLink3Description: LCSC Part URL; ComponentLink3URL: https://lcsc.com/product-detail/Inductors-SMD_microgate-microgate-MGCI1608H10NJT-LF_C281018.html
footprint IND-0603 (0603 (1608M) Inductor)
pins: 1, 2

## MGCI1608H12NJT-LF
designator L?  Inductance: 12nH
Inductor, 12nH, ±5%, 300mΩ, 300mA, SMD 0603; Manufacturer: microgate; Manufacturer Part Number: MGCI1608H12NJT-LF; Package Size: 0603; JLCPCB Basic Part: No; JLCPCB Part Number: C310875; Supplier 1: LCSC; Category: Inductors; Supplier Part Number 1: C310875; Tolerance: ±5%; Rated Current: 300mA; DC Resistance: 300mΩ; RoHS: Yes; ComponentLink1Description: Datasheet; ComponentLink1URL: https://wmsc.lcsc.com/wmsc/upload/file/pdf/v2/lcsc/2304140030_microgate-MGCI1608H12NJT-LF_C310875.pdf; ComponentLink2Description: JLCPCB Part URL; ComponentLink2URL: https://jlcpcb.com/partdetail/C310875; ComponentLink3Description: LCSC Part URL; ComponentLink3URL: https://lcsc.com/product-detail/Inductors-SMD_microgate-microgate-MGCI1608H12NJT-LF_C310875.html
footprint IND-0603 (0603 (1608M) Inductor)
pins: 1, 2

## MGCI1608H15NJT-LF
designator L?  Inductance: 15nH
Inductor, 15nH, ±5%, 320mΩ, 300mA, SMD 0603; Manufacturer: microgate; Manufacturer Part Number: MGCI1608H15NJT-LF; Package Size: 0603; JLCPCB Basic Part: No; JLCPCB Part Number: C281019; Supplier 1: LCSC; Category: Inductors; Supplier Part Number 1: C281019; Tolerance: ±5%; Rated Current: 300mA; DC Resistance: 320mΩ; RoHS: Yes; ComponentLink1Description: Datasheet; ComponentLink1URL: https://wmsc.lcsc.com/wmsc/upload/file/pdf/v2/lcsc/2304140030_microgate-MGCI1608H15NJT-LF_C281019.pdf; ComponentLink2Description: JLCPCB Part URL; ComponentLink2URL: https://jlcpcb.com/partdetail/C281019; ComponentLink3Description: LCSC Part URL; ComponentLink3URL: https://lcsc.com/product-detail/Inductors-SMD_microgate-microgate-MGCI1608H15NJT-LF_C281019.html
footprint IND-0603 (0603 (1608M) Inductor)
pins: 1, 2

## MGCI1608H22NJT-LF
designator L?  Inductance: 22nH
Inductor, 22nH, ±5%, 400mΩ, 300mA, SMD 0603; Manufacturer: microgate; Manufacturer Part Number: MGCI1608H22NJT-LF; Package Size: 0603; JLCPCB Basic Part: No; JLCPCB Part Number: C310877; Supplier 1: LCSC; Category: Inductors; Supplier Part Number 1: C310877; Tolerance: ±5%; Rated Current: 300mA; DC Resistance: 400mΩ; RoHS: Yes; ComponentLink1Description: Datasheet; ComponentLink1URL: https://wmsc.lcsc.com/wmsc/upload/file/pdf/v2/lcsc/2304140030_microgate-MGCI1608H22NJT-LF_C310877.pdf; ComponentLink2Description: JLCPCB Part URL; ComponentLink2URL: https://jlcpcb.com/partdetail/C310877; ComponentLink3Description: LCSC Part URL; ComponentLink3URL: https://lcsc.com/product-detail/Inductors-SMD_microgate-microgate-MGCI1608H22NJT-LF_C310877.html
footprint IND-0603 (0603 (1608M) Inductor)
pins: 1, 2

## MGCI1608H27NJT-LF
designator L?  Inductance: 27nH
Inductor, 27nH, ±5%, 450mΩ, 300mA, SMD 0603; Manufacturer: microgate; Manufacturer Part Number: MGCI1608H27NJT-LF; Package Size: 0603; JLCPCB Basic Part: No; JLCPCB Part Number: C310878; Supplier 1: LCSC; Category: Inductors; Supplier Part Number 1: C310878; Tolerance: ±5%; Rated Current: 300mA; DC Resistance: 450mΩ; RoHS: Yes; ComponentLink1Description: Datasheet; ComponentLink1URL: https://wmsc.lcsc.com/wmsc/upload/file/pdf/v2/lcsc/2304140030_microgate-MGCI1608H27NJT-LF_C310878.pdf; ComponentLink2Description: JLCPCB Part URL; ComponentLink2URL: https://jlcpcb.com/partdetail/C310878; ComponentLink3Description: LCSC Part URL; ComponentLink3URL: https://lcsc.com/product-detail/Inductors-SMD_microgate-microgate-MGCI1608H27NJT-LF_C310878.html
footprint IND-0603 (0603 (1608M) Inductor)
pins: 1, 2

## MGCI1608H33NJT-LF
designator L?  Inductance: 33nH
Inductor, 33nH, ±5%, 550mΩ, 300mA, SMD 0603; Manufacturer: microgate; Manufacturer Part Number: MGCI1608H33NJT-LF; Package Size: 0603; JLCPCB Basic Part: No; JLCPCB Part Number: C310879; Supplier 1: LCSC; Category: Inductors; Supplier Part Number 1: C310879; Tolerance: ±5%; Rated Current: 300mA; DC Resistance: 550mΩ; RoHS: Yes; ComponentLink1Description: Datasheet; ComponentLink1URL: https://wmsc.lcsc.com/wmsc/upload/file/pdf/v2/lcsc/2304140030_microgate-MGCI1608H33NJT-LF_C310879.pdf; ComponentLink2Description: JLCPCB Part URL; ComponentLink2URL: https://jlcpcb.com/partdetail/C310879; ComponentLink3Description: LCSC Part URL; ComponentLink3URL: https://lcsc.com/product-detail/Inductors-SMD_microgate-microgate-MGCI1608H33NJT-LF_C310879.html
footprint IND-0603 (0603 (1608M) Inductor)
pins: 1, 2

## MGCI1608H39NJT-LF
designator L?  Inductance: 39nH
Inductor, 39nH, ±5%, 600mΩ, 300mA, SMD 0603; Manufacturer: microgate; Manufacturer Part Number: MGCI1608H39NJT-LF; Package Size: 0603; JLCPCB Basic Part: No; JLCPCB Part Number: C310880; Supplier 1: LCSC; Category: Inductors; Supplier Part Number 1: C310880; Tolerance: ±5%; Rated Current: 300mA; DC Resistance: 600mΩ; RoHS: Yes; ComponentLink1Description: Datasheet; ComponentLink1URL: https://wmsc.lcsc.com/wmsc/upload/file/pdf/v2/lcsc/2304140030_microgate-MGCI1608H39NJT-LF_C310880.pdf; ComponentLink2Description: JLCPCB Part URL; ComponentLink2URL: https://jlcpcb.com/partdetail/C310880; ComponentLink3Description: LCSC Part URL; ComponentLink3URL: https://lcsc.com/product-detail/Inductors-SMD_microgate-microgate-MGCI1608H39NJT-LF_C310880.html
footprint IND-0603 (0603 (1608M) Inductor)
pins: 1, 2

## MGCI1608H47NJT-LF
designator L?  Inductance: 47nH
Inductor, 47nH, ±5%, 700mΩ, 300mA, SMD 0603; Manufacturer: microgate; Manufacturer Part Number: MGCI1608H47NJT-LF; Package Size: 0603; JLCPCB Basic Part: No; JLCPCB Part Number: C310881; Supplier 1: LCSC; Category: Inductors; Supplier Part Number 1: C310881; Tolerance: ±5%; Rated Current: 300mA; DC Resistance: 700mΩ; RoHS: Yes; ComponentLink1Description: Datasheet; ComponentLink1URL: https://wmsc.lcsc.com/wmsc/upload/file/pdf/v2/lcsc/2304140030_microgate-MGCI1608H47NJT-LF_C310881.pdf; ComponentLink2Description: JLCPCB Part URL; ComponentLink2URL: https://jlcpcb.com/partdetail/C310881; ComponentLink3Description: LCSC Part URL; ComponentLink3URL: https://lcsc.com/product-detail/Inductors-SMD_microgate-microgate-MGCI1608H47NJT-LF_C310881.html
footprint IND-0603 (0603 (1608M) Inductor)
pins: 1, 2

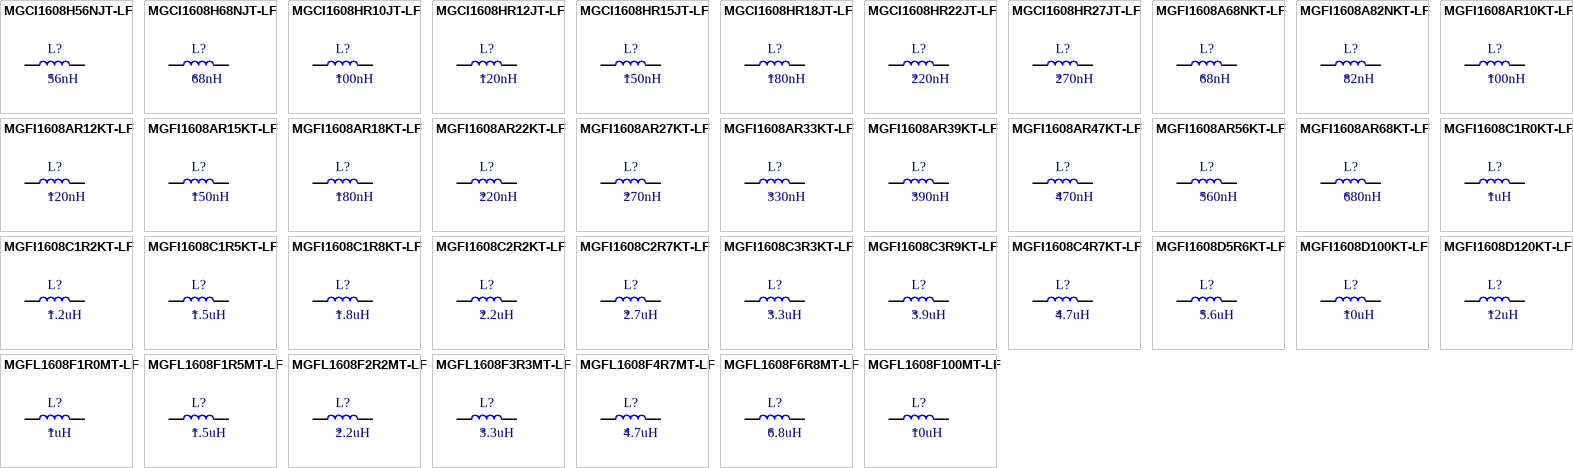
[diagram p19: symbols MGCI1608H56NJT-LF to MGFL1608F100MT-LF]

## MGCI1608H56NJT-LF
designator L?  Inductance: 56nH
Inductor, 56nH, ±5%, 750mΩ, 300mA, SMD 0603; Manufacturer: microgate; Manufacturer Part Number: MGCI1608H56NJT-LF; Package Size: 0603; JLCPCB Basic Part: No; JLCPCB Part Number: C310882; Supplier 1: LCSC; Category: Inductors; Supplier Part Number 1: C310882; Tolerance: ±5%; Rated Current: 300mA; DC Resistance: 750mΩ; RoHS: Yes; ComponentLink1Description: Datasheet; ComponentLink1URL: https://wmsc.lcsc.com/wmsc/upload/file/pdf/v2/lcsc/2304140030_microgate-MGCI1608H56NJT-LF_C310882.pdf; ComponentLink2Description: JLCPCB Part URL; ComponentLink2URL: https://jlcpcb.com/partdetail/C310882; ComponentLink3Description: LCSC Part URL; ComponentLink3URL: https://lcsc.com/product-detail/Inductors-SMD_microgate-microgate-MGCI1608H56NJT-LF_C310882.html
footprint IND-0603 (0603 (1608M) Inductor)
pins: 1, 2

## MGCI1608H68NJT-LF
designator L?  Inductance: 68nH
Inductor, 68nH, ±5%, 850mΩ, 300mA, SMD 0603; Manufacturer: microgate; Manufacturer Part Number: MGCI1608H68NJT-LF; Package Size: 0603; JLCPCB Basic Part: No; JLCPCB Part Number: C310883; Supplier 1: LCSC; Category: Inductors; Supplier Part Number 1: C310883; Tolerance: ±5%; Rated Current: 300mA; DC Resistance: 850mΩ; RoHS: Yes; ComponentLink1Description: Datasheet; ComponentLink1URL: https://wmsc.lcsc.com/wmsc/upload/file/pdf/v2/lcsc/2304140030_microgate-MGCI1608H68NJT-LF_C310883.pdf; ComponentLink2Description: JLCPCB Part URL; ComponentLink2URL: https://jlcpcb.com/partdetail/C310883; ComponentLink3Description: LCSC Part URL; ComponentLink3URL: https://lcsc.com/product-detail/Inductors-SMD_microgate-microgate-MGCI1608H68NJT-LF_C310883.html
footprint IND-0603 (0603 (1608M) Inductor)
pins: 1, 2

## MGCI1608HR10JT-LF
designator L?  Inductance: 100nH
Inductor, 100nH, ±5%, 1Ω, 300mA, SMD 0603; Manufacturer: microgate; Manufacturer Part Number: MGCI1608HR10JT-LF; Package Size: 0603; JLCPCB Basic Part: No; JLCPCB Part Number: C281035; Supplier 1: LCSC; Category: Inductors; Supplier Part Number 1: C281035; Tolerance: ±5%; Rated Current: 300mA; DC Resistance: 1Ω; RoHS: Yes; ComponentLink1Description: Datasheet; ComponentLink1URL: https://wmsc.lcsc.com/wmsc/upload/file/pdf/v2/lcsc/2304140030_microgate-MGCI1608HR10JT-LF_C281035.pdf; ComponentLink2Description: JLCPCB Part URL; ComponentLink2URL: https://jlcpcb.com/partdetail/C281035; ComponentLink3Description: LCSC Part URL; ComponentLink3URL: https://lcsc.com/product-detail/Inductors-SMD_microgate-microgate-MGCI1608HR10JT-LF_C281035.html
footprint IND-0603 (0603 (1608M) Inductor)
pins: 1, 2

## MGCI1608HR12JT-LF
designator L?  Inductance: 120nH
Inductor, 120nH, ±5%, 1.3Ω, 300mA, SMD 0603; Manufacturer: microgate; Manufacturer Part Number: MGCI1608HR12JT-LF; Package Size: 0603; JLCPCB Basic Part: No; JLCPCB Part Number: C310884; Supplier 1: LCSC; Category: Inductors; Supplier Part Number 1: C310884; Tolerance: ±5%; Rated Current: 300mA; DC Resistance: 1.3Ω; RoHS: Yes; ComponentLink1Description: Datasheet; ComponentLink1URL: https://wmsc.lcsc.com/wmsc/upload/file/pdf/v2/lcsc/2304140030_microgate-MGCI1608HR12JT-LF_C310884.pdf; ComponentLink2Description: JLCPCB Part URL; ComponentLink2URL: https://jlcpcb.com/partdetail/C310884; ComponentLink3Description: LCSC Part URL; ComponentLink3URL: https://lcsc.com/product-detail/Inductors-SMD_microgate-microgate-MGCI1608HR12JT-LF_C310884.html
footprint IND-0603 (0603 (1608M) Inductor)
pins: 1, 2

## MGCI1608HR15JT-LF
designator L?  Inductance: 150nH
Inductor, 150nH, ±5%, 1.5Ω, 300mA, SMD 0603; Manufacturer: microgate; Manufacturer Part Number: MGCI1608HR15JT-LF; Package Size: 0603; JLCPCB Basic Part: No; JLCPCB Part Number: C281036; Supplier 1: LCSC; Category: Inductors; Supplier Part Number 1: C281036; Tolerance: ±5%; Rated Current: 300mA; DC Resistance: 1.5Ω; RoHS: Yes; ComponentLink1Description: Datasheet; ComponentLink1URL: https://wmsc.lcsc.com/wmsc/upload/file/pdf/v2/lcsc/2304140030_microgate-MGCI1608HR15JT-LF_C281036.pdf; ComponentLink2Description: JLCPCB Part URL; ComponentLink2URL: https://jlcpcb.com/partdetail/C281036; ComponentLink3Description: LCSC Part URL; ComponentLink3URL: https://lcsc.com/product-detail/Inductors-SMD_microgate-microgate-MGCI1608HR15JT-LF_C281036.html
footprint IND-0603 (0603 (1608M) Inductor)
pins: 1, 2

## MGCI1608HR18JT-LF
designator L?  Inductance: 180nH
Inductor, 180nH, ±5%, 1.8Ω, 300mA, SMD 0603; Manufacturer: microgate; Manufacturer Part Number: MGCI1608HR18JT-LF; Package Size: 0603; JLCPCB Basic Part: No; JLCPCB Part Number: C310885; Supplier 1: LCSC; Category: Inductors; Supplier Part Number 1: C310885; Tolerance: ±5%; Rated Current: 300mA; DC Resistance: 1.8Ω; RoHS: Yes; ComponentLink1Description: Datasheet; ComponentLink1URL: https://wmsc.lcsc.com/wmsc/upload/file/pdf/v2/lcsc/2304140030_microgate-MGCI1608HR18JT-LF_C310885.pdf; ComponentLink2Description: JLCPCB Part URL; ComponentLink2URL: https://jlcpcb.com/partdetail/C310885; ComponentLink3Description: LCSC Part URL; ComponentLink3URL: https://lcsc.com/product-detail/Inductors-SMD_microgate-microgate-MGCI1608HR18JT-LF_C310885.html
footprint IND-0603 (0603 (1608M) Inductor)
pins: 1, 2

## MGCI1608HR22JT-LF
designator L?  Inductance: 220nH
Inductor, 220nH, ±5%, 2.1Ω, 300mA, SMD 0603; Manufacturer: microgate; Manufacturer Part Number: MGCI1608HR22JT-LF; Package Size: 0603; JLCPCB Basic Part: No; JLCPCB Part Number: C310886; Supplier 1: LCSC; Category: Inductors; Supplier Part Number 1: C310886; Tolerance: ±5%; Rated Current: 300mA; DC Resistance: 2.1Ω; RoHS: Yes; ComponentLink1Description: Datasheet; ComponentLink1URL: https://wmsc.lcsc.com/wmsc/upload/file/pdf/v2/lcsc/2304140030_microgate-MGCI1608HR22JT-LF_C310886.pdf; ComponentLink2Description: JLCPCB Part URL; ComponentLink2URL: https://jlcpcb.com/partdetail/C310886; ComponentLink3Description: LCSC Part URL; ComponentLink3URL: https://lcsc.com/product-detail/Inductors-SMD_microgate-microgate-MGCI1608HR22JT-LF_C310886.html
footprint IND-0603 (0603 (1608M) Inductor)
pins: 1, 2